# Altium schematic symbol library IC.SchLib: 555 symbols (part 8 of 15)
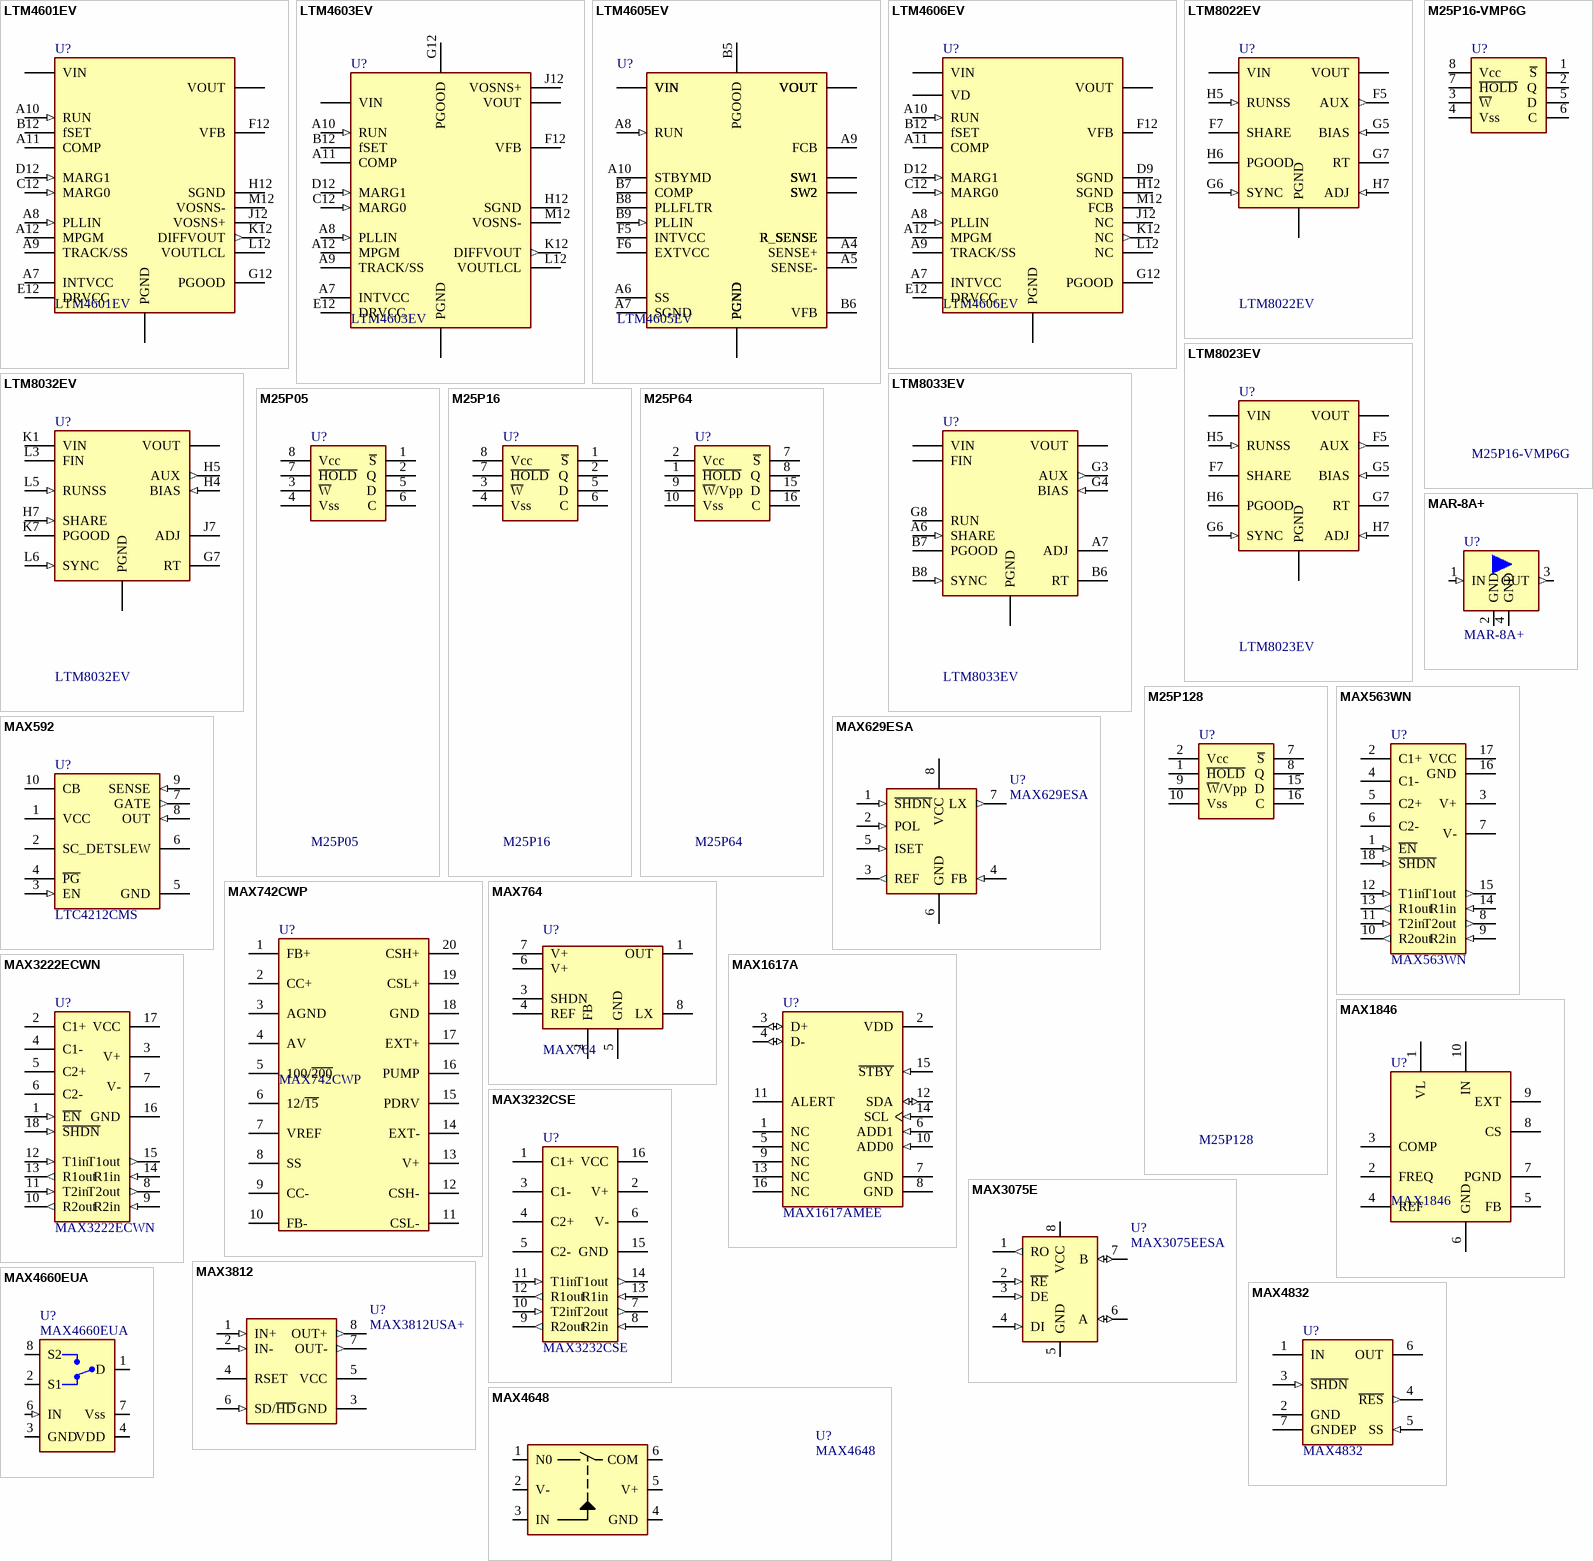
[diagram p77: symbols LTM4601EV to MAX4832]

## LTM8023EV
designator U?
2A, 36Vin DC/DC Module nonisolated; Manufacturer: Linear Technologies; Manufacturer No: LTM8023EV#PBF; Comment2: 3.6-36Vin; 0.8-10Vout; 2A; Sort: 510; Tech: SMDR; Package: LGA50; Price: 0
footprint LGA50 (LGA, 50-Leads, Body 11,25x9,0mm,  Pitch 1,27mm)
pins: A1 VOUT (power), A2 VOUT (power), A3 VOUT (power), A4 VOUT (power), A5 PGND (power), A6 PGND (power), A7 PGND (power), B1 VOUT (power), B2 VOUT (power), B3 VOUT (power), B4 VOUT (power), B5 PGND (power), B6 PGND (power), B7 PGND (power), C1 VOUT (power), C2 VOUT (power), C3 VOUT (power), C4 VOUT (power), C5 PGND (power), C6 PGND (power), C7 PGND (power), D1 PGND (power), D2 PGND (power), D3 PGND (power), D4 PGND (power), D5 PGND (power), D6 PGND (power), D7 PGND (power), E1 PGND (power), E2 PGND (power), E3 PGND (power), E4 PGND (power), E5 PGND (power), E6 PGND (power), E7 PGND (power), F5 AUX (out), F6 PGND (power), F7 SHARE, G1 VIN (power), G2 VIN (power), G3 VIN (power), G5 BIAS (in), G6 SYNC (in), G7 RT, H1 VIN (power), H2 VIN (power), H3 VIN (power), H5 RUNSS (in), H6 PGOOD (oc), H7 ADJ (in), M10 VOUT (power) hidden, M11 VOUT (power) hidden

## LTM8032EV
designator U?
2A, 36Vin DC/DC Module nonisolated; Manufacturer: Linear Technologies; Manufacturer No: LTM8032EV#PBF; Comment2: 3.6-36Vin; 0.8-10Vout; 2A low EMI; Sort: 510; Tech: SMDR; Package: LGA71; Price: 0
footprint LGA71 (LGA, 71-Leads, Body 15,0x9,0mm,  Pitch 1,27mm)
pins: A1 VOUT (power), A2 VOUT (power), A3 VOUT (power), A4 VOUT (power), A5 PGND (power), A6 PGND (power), A7 PGND (power), B1 VOUT (power), B2 VOUT (power), B3 VOUT (power), B4 VOUT (power), B5 PGND (power), B6 PGND (power), B7 PGND (power), C1 VOUT (power), C2 VOUT (power), C3 VOUT (power), C4 VOUT (power), C5 PGND (power), C6 PGND (power), C7 PGND (power), D1 VOUT (power), D2 VOUT (power), D3 VOUT (power), D4 VOUT (power), D5 PGND (power), D6 PGND (power), D7 PGND (power), E1 PGND (power), E2 PGND (power), E3 PGND (power), E4 PGND (power), E5 PGND (power), E6 PGND (power), E7 PGND (power), F1 PGND (power), F2 PGND (power), F3 PGND (power), F4 PGND (power), F5 PGND (power), F6 PGND (power), F7 PGND (power), G1 PGND (power), G2 PGND (power), G3 PGND (power), G4 PGND (power), G5 PGND (power), G6 PGND (power), G7 RT, H1 PGND (power), H2 PGND (power), H3 PGND (power), H4 BIAS (in), H5 AUX (out), H6 PGND (power), H7 SHARE (in), J5 PGND (power), J6 PGND (power), J7 ADJ, K1 VIN (power), K2 VIN (power), K3 FIN, K5 PGND (power), K6 PGND (power), K7 PGOOD, L1 VIN (power), L2 VIN (power), L3 FIN (power), L5 RUNSS (in), L6 SYNC (in), L7 PGND (power)

## LTM8033EV
designator U?
3A, 36Vin DC/DC Module nonisolated; Manufacturer: Linear Technologies; Manufacturer No: LTM8033EV#PBF; Comment2: 3.6-36Vin; 0.8-24Vout; 3A low EMI; Sort: 510; Tech: SMDR; Package: LGA71; Price: 0
footprint LGA76 (LGA, 76-Leads, Body 15,0x11,25mm,  Pitch 1,27mm)
pins: A1 VOUT (power), A2 VOUT (power), A3 VOUT (power), A4 PGND (power), A5 PGND (power), A6 SHARE (in), A7 ADJ, A8 PGND (power), B1 VOUT (power), B2 VOUT (power), B3 VOUT (power), B4 PGND (power), B5 PGND (power), B6 RT, B7 PGOOD, B8 SYNC (in), C1 VOUT (power), C2 VOUT (power), C3 VOUT (power), C4 PGND (power), C5 PGND (power), C6 PGND (power), C7 PGND (power), C8 PGND (power), D1 VOUT (power), D2 VOUT (power), D3 VOUT (power), D4 PGND (power), D5 PGND (power), D6 PGND (power), D7 PGND (power), D8 PGND (power), E1 PGND (power), E2 PGND (power), E3 PGND (power), E4 PGND (power), E5 PGND (power), E6 PGND (power), E7 PGND (power), E8 PGND (power), F1 PGND (power), F2 PGND (power), F3 PGND (power), F4 PGND (power), F5 PGND (power), F6 PGND (power), F7 PGND (power), F8 PGND (power), G1 PGND (power), G2 PGND (power), G3 AUX (out), G4 BIAS (in), G5 PGND (power), G6 PGND (power), G8 RUN, H5 PGND (power), H6 PGND (power), J1 VIN (power), J2 VIN (power), J3 VIN (power), J5 PGND (power), J6 PGND (power), J8 FIN (power), K1 VIN (power), K2 VIN (power), K3 VIN (power), K5 PGND (power), K6 PGND (power), K8 FIN, L1 VIN (power), L2 VIN (power), L3 VIN (power), L5 PGND (power), L6 PGND (power), L8 FIN

## M25P05
designator U?
512 Kbit, low voltage, serial flash memory with 50MHz SPI bus; Manufacturer: Numonyx; Manufacturer No: M25P05-AVMN6P; Comment2: 512Kbit, SPI, 40/50MHz; Sort: 510; Tech: SMDR; Package: SOIC8; Price: 0
footprint SOIC8-1
pins: 1 ~{S}, 2 Q, 3 ~{W}, 4 Vss, 5 D, 6 C, 7 ~{HOLD}, 8 Vcc

## M25P16
designator U?
16Mbit, low voltage, serial flash memory with 50MHz SPI bus; Manufacturer: Numonyx; Manufacturer No: M25P16-VMN6P; Comment2: 16Mbit, SPI, 40/50MHz; Sort: 510; Tech: SMDR; Package: SOIC8; Price: 0
footprint SOIC8-1
pins: 1 ~{S}, 2 Q, 3 ~{W}, 4 Vss, 5 D, 6 C, 7 ~{HOLD}, 8 Vcc

## M25P16-VMP6G
designator U?
16Mbit, low voltage, serial flash memory with 50MHz SPI bus; Manufacturer: Micron; Comment2: 16Mbit, SPI, 75MHz, 2.7~3.6Vcc,  -40~85degC; Sort: 510; Tech: SMDR; Manufacturer No: M25P16-VMP6G; Package: VFQFPN8; Price: 0
footprint DFN127P600X500X100EP340-8N (QFN, 8-Leads, Body 5,0x6,0mm (max), Pitch 1,27mm, IPC Medium Density)
pins: 1 ~{S}, 2 Q, 3 ~{W}, 4 Vss, 5 D, 6 C, 7 ~{HOLD}, 8 Vcc

## M25P64
designator U?
64 Mbit, low voltage, serial flash memory with 50MHz SPI bus; Manufacturer: Numonyx; Manufacturer No: M25P64-VMF6TP; Comment2: 64Mbit, SPI, 50MHz; Sort: 510; Tech: SMDR; Package: SO16; Price: 0
footprint Model Name (Footprint not found)
footprint SOIC16WN (SOIC, 16-Leads, Body 10,4x7,5mm (max), Pitch 1,27mm, IPC Medium Density)
pins: 1 ~{HOLD}, 2 Vcc, 7 ~{S}, 8 Q, 9 ~{W}/Vpp, 10 Vss, 15 D, 16 C

## M25P128
designator U?
128 Mbit, low voltage, serial flash memory with 50MHz SPI bus; Manufacturer: Numonyx; Manufacturer No: M25P128-VMF6TPB; Comment2: 128Mbit, SPI, 50MHz; Sort: 510; Tech: SMDR; Package: SO16; Price: 0
footprint Model Name (Footprint not found)
footprint SOIC16WN (SOIC, 16-Leads, Body 10,4x7,5mm (max), Pitch 1,27mm, IPC Medium Density)
pins: 1 ~{HOLD}, 2 Vcc, 7 ~{S}, 8 Q, 9 ~{W}/Vpp, 10 Vss, 15 D, 16 C

## MAR-8A+
designator U?
Monolithic Amplifier DC - 1GHz; Manufacturer: MiniCircuits; Sort: 530; Tech: SMDR; Manufacturer No: MAR-8A+; Package: VV105; Price: 0
footprint VV105 (RF transistor 4pin D2.2x1.5mm)
pins: 1 IN (in), 2 GND (power), 3 OUT (out), 4 GND (power)

## MAX563WN
designator U?
Dual transciever +3V3 with shitdown; Manufacturer: Maxim; Manufacturer No: MAX563WN+; Sort: 510; Tech: SMDR; Package: SOIC18W; Price: 0
footprint SOIC18WN (SOIC18W, Body 11,7x7,6mm, R1,27mm, IPC Medium Density)
pins: 1 ~{EN} (in), 2 C1+, 3 V+, 4 C1-, 5 C2+, 6 C2-, 7 V-, 8 T2out (out), 9 R2in (in), 10 R2out (out), 11 T2in (in), 12 T1in (in), 13 R1out (out), 14 R1in (in), 15 T1out (out), 16 GND (power), 17 VCC (power), 18 ~{SHDN} (in)

## MAX592
designator U?, comment LTC4212CMS
Hot swap controller MSOP10 with ON control; Manufacturer: Maxim; Comment2: 2.5-16.5V; Sort: 510; Tech: SMDR; Manufacturer No: LTC4212CMS; Package: MSOP10; Price: 0
footprint SSOP16 (SSOP 16-Leads, Body 5,0x4,0mm (max), Pitch 0,63mm, IPC Medium Density)
pins: 1 VCC (power), 2 SC_DET, 3 EN (in), 4 ~{PG} (oc), 5 GND (power), 6 SLEW, 7 GATE (out), 8 OUT (in), 9 SENSE (in), 10 CB

## MAX629ESA
designator U?
Step up converter 0.5A SOIC8; Manufacturer: Maxim; Sort: 510; Tech: SMDR; Manufacturer No: MAX629ESA; Package: SOIC8; Price: 0
footprint SOIC8-1
pins: 1 ~{SHDN} (in), 2 POL (in), 3 REF (out), 4 FB (in), 5 ISET (in), 6 GND (power), 7 LX (out), 8 VCC (power)

## MAX742CWP
designator U?
Switch-Mode Regulator with  +5V to ±12V or ±15V Dual Output; Manufacturer: Maxim; Sort: 510; Tech: SMDR; Manufacturer No: MAX742CWP; Package: SO20; Price: 0
footprint SOIC20N (SOIC20, Body 12,9x7,6mm, R1,27mm, IPC Medium Density)
pins: 1 FB+, 2 CC+, 3 AGND, 4 AV, 5 100/~{200}, 6 12/~{15}, 7 VREF, 8 SS, 9 CC-, 10 FB-, 11 CSL-, 12 CSH-, 13 V+, 14 EXT-, 15 PDRV, 16 PUMP, 17 EXT+, 18 GND, 19 CSL+, 20 CSH+

## MAX764
designator U?
-5V/-12V/-15V or Adjustable, High-Efficency, Low Iq DC-DC Inverters; Manufacturer: Maxim; Manufacturer No: MAX764ESA; Sort: 510; Tech: SMDR; Package: SOIC8; Price: 0
footprint SOIC8-1
pins: 1 OUT, 2 FB, 3 SHDN, 4 REF, 5 GND, 6 V+, 7 V+, 8 LX

## MAX1617A
designator U?, comment MAX1617AMEE
SMBus Temperature Sensor with Internal and External Diode Input; Manufacturer: Maxim; Manufacturer No: MAX1617AMEE+; Sort: 510; Tech: SMDR; Package: QSOP16; Price: 0
3D model QSOP16 (SSOP; 16 Leads; Body Width 3.9 mm; Pitch 0.635 mm)
footprint QSOP16 (SSOP; 16 Leads; Body Width 3.9 mm; Pitch 0.635 mm)
pins: 1 NC, 2 VDD (power), 3 D+ (io), 4 D- (io), 5 NC, 6 ADD1 (in), 7 GND (power), 8 GND (power), 9 NC, 10 ADD0 (in), 11 ALERT (oc), 12 SDA (io), 13 NC, 14 SCL (in), 15 ~{STBY} (in), 16 NC

## MAX1846
designator U?
High-Efficiency, Current-Mode,  Inverting PWM Controller; Manufacturer: Maxim; Manufacturer No: MAX1846EUB+; Comment2: 3-16.5Vin, 100-500kHz PWM; Sort: 510; Tech: SMDR; Package: 10 uMAX; Price: 0
footprint UMAX (uMAX/uSOP 10pin, Body 3.05x3.05mm (max), Pitch 0,5mm)
pins: 1 VL, 2 FREQ, 3 COMP, 4 REF, 5 FB, 6 GND, 7 PGND, 8 CS, 9 EXT, 10 IN

## MAX3075E
designator U?, comment MAX3075EESA
RS485 transceiver 3V3 TXen, RXen 500Kbps; Manufacturer: Maxim; Sort: 510; Tech: SMDR; Manufacturer No: MAX3075EESA; Package: SOIC8; Price: 0
footprint SOIC8-1
pins: 1 RO (out), 2 ~{RE} (in), 3 DE (in), 4 DI (in), 5 GND (power), 6 A (io), 7 B (io), 8 VCC (power)

## MAX3222ECWN
designator U?
Dual transciever +3V3 with shitdown; Manufacturer: Maxim; Manufacturer No: MAX3222ECWN+; Sort: 510; Tech: SMDR; Package: SOIC18W; Price: 0
footprint SOIC18WN (SOIC18W, Body 11,7x7,6mm, R1,27mm, IPC Medium Density)
pins: 1 ~{EN} (in), 2 C1+, 3 V+, 4 C1-, 5 C2+, 6 C2-, 7 V-, 8 T2out (out), 9 R2in (in), 10 R2out (out), 11 T2in (in), 12 T1in (in), 13 R1out (out), 14 R1in (in), 15 T1out (out), 16 GND (power), 17 VCC (power), 18 ~{SHDN} (in)

## MAX3232CSE
designator U?
Dual RS232 transciever +3V3; Manufacturer: Maxim; Sort: 510; Tech: SMDR; Manufacturer No: MAX3232CSE; Package: SOIC16; Price: 0
footprint SOIC16-1 (Small IC 16 pin)
pins: 1 C1+, 2 V+, 3 C1-, 4 C2+, 5 C2-, 6 V-, 7 T2out (out), 8 R2in (in), 9 R2out (out), 10 T2in (in), 11 T1in (in), 12 R1out (out), 13 R1in (in), 14 T1out (out), 15 GND (power), 16 VCC (power)

## MAX3812
designator U?, comment MAX3812USA+
Multirate SMPTE SD/HD Cable Driver  with Selectable Slew Rate; Manufacturer: Maxim; Comment2: +3.3V; Sort: 510; Tech: SMDR; Manufacturer No: MAX3812USA+; Package: SOIC8; Price: 0
footprint SOIC8-1
pins: 1 IN+ (in), 2 IN- (in), 3 GND (power), 4 RSET, 5 VCC (power), 6 SD/~{HD} (in), 7 OUT- (out), 8 OUT+ (out)

## MAX4648
designator U?
25R SPST Analog Switches in SOT23-6; Manufacturer: Maxim; Manufacturer No: MAX4648EUT-T+; Sort: 510; Tech: SMDR; Package: SOT23-6; Price: 0
footprint SOT23-6
pins: 1 N0, 2 V-, 3 IN, 4 GND, 5 V+, 6 COM

## MAX4660EUA
designator U?
High-Current, 25R, SPDT, CMOS  Analog Switch; Manufacturer: Maxim; Comment2: ±4.5..±20Vcc 25Rsw 150mAsw; Sort: 510; Tech: SMDR; Manufacturer No: MAX4660EUA; Package: 8 uMAX-EP; Price: 0
signal-integrity model Model Name (Model Description)
footprint UMAX8EP-L (TSOP, 8-Leads, Body 3,0x3,0mm (max), Pitch 0,65mm, IPC High Density)
footprint UMAX8EP-N (TSOP, 8-Leads, Body 3,0x3,0mm (max), Pitch 0,65mm, IPC Medium Density)
pins: 1 D, 2 S1, 3 GND (power), 4 VDD (power), 6 IN (in), 7 Vss (power), 8 S2, 9 EP (power)

## MAX4832
designator U?
Low drop regulator 0.1A SOT23-5; Manufacturer: Maxim; Sort: 510; Tech: SMDR; Price: 0
footprint QFN16N-2 (QFN, 16-Leads, Body 3,0x3,0mm (max), Pitch 0,50mm, IPC Medium Density)
pins: 1 IN (power), 2 GND (power), 3 ~{SHDN} (in), 4 ~{RES} (out), 5 SS (in), 6 OUT (power), 7 GNDEP (power)

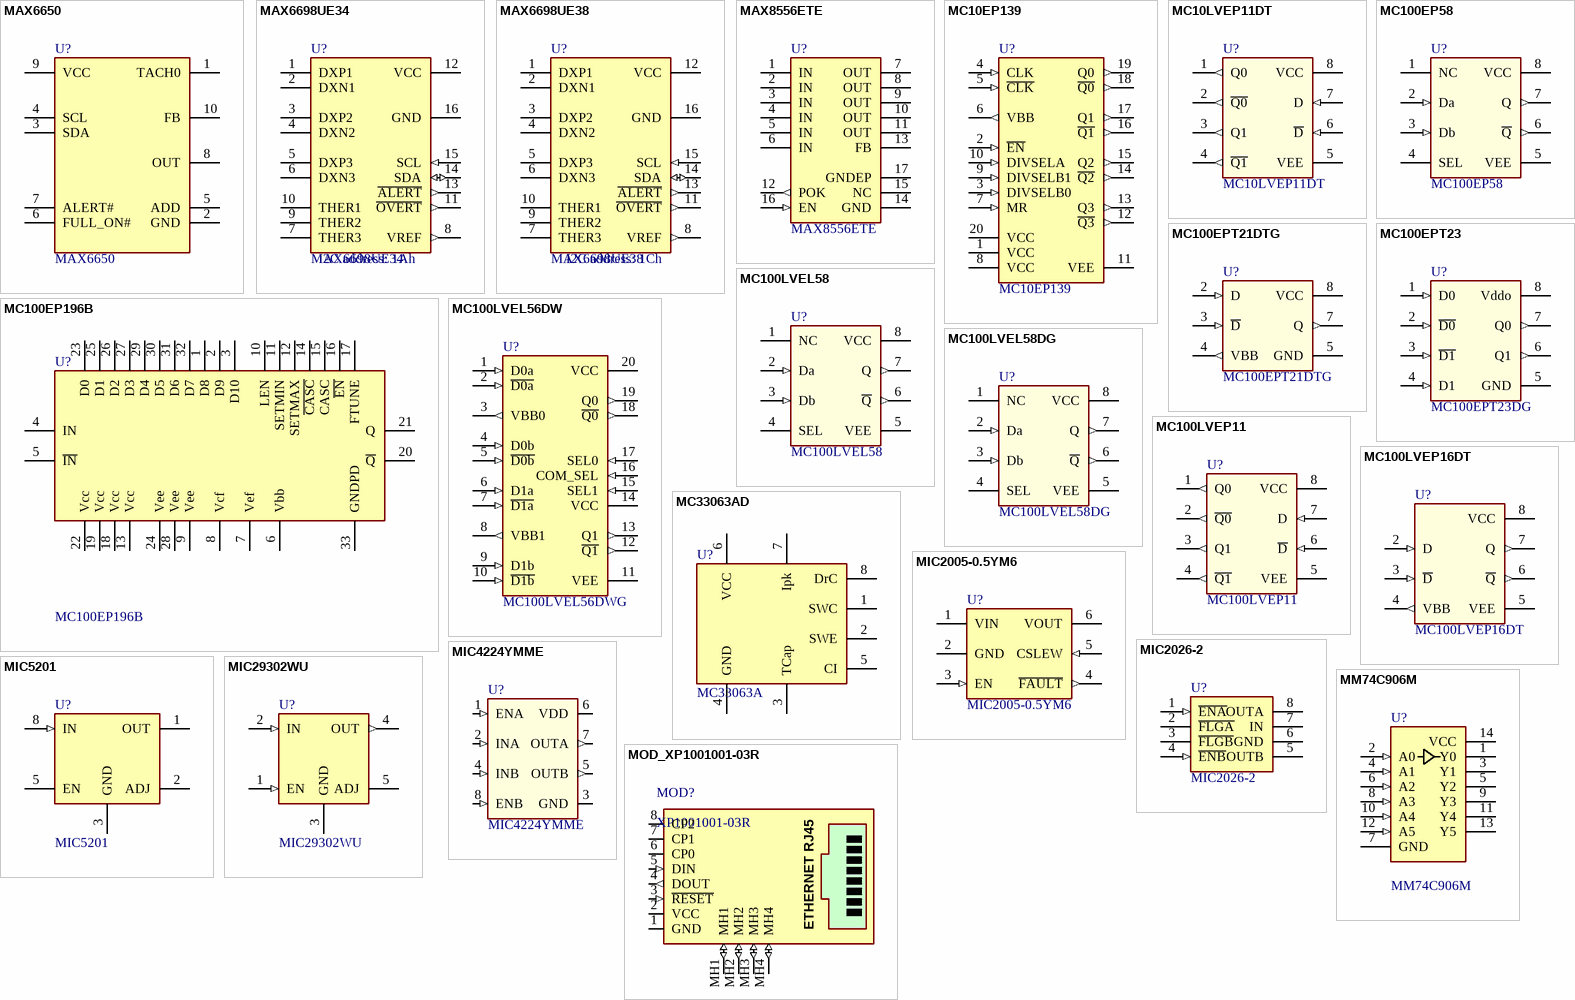
[diagram p32: symbols MAX6650 to MOD_XP1001001-03R]

## MAX6650
designator U?
Fan speed regulator and monitor I2C compatible; Manufacturer: Maxim; Manufacturer No: MAX6650EUB; Sort: 510; Tech: SMDR; Package: uMAX; Price: 0
footprint UMAX (uMAX/uSOP 10pin, Body 3.05x3.05mm (max), Pitch 0,5mm)
pins: 1 TACH0, 2 GND (power), 3 SDA, 4 SCL, 5 ADD, 6 FULL_ON#, 7 ALERT#, 8 OUT, 9 VCC (power), 10 FB

## MAX6698UE34
designator U?  I2C address: 1Ah
SMBus Temperature Sensor with Internal and External Diode/Thermistor Input; Manufacturer: Maxim, Mouser; Manufacturer No: MAX6698UE38+, 700-MAX6698UE34; Comment2: 3..5.5Vcc 1mAcc; Sort: 510; Tech: SMDR; Package: TSSOP16; Price: 6.8
3D model QSOP16 (SSOP; 16 Leads; Body Width 3.9 mm; Pitch 0.635 mm)
footprint TSSOP16 (TSSOP16 5x4.4mm R0.65mm)
pins: 1 DXP1, 2 DXN1, 3 DXP2, 4 DXN2, 5 DXP3, 6 DXN3, 7 THER3, 8 VREF (out), 9 THER2, 10 THER1, 11 ~{OVERT} (out), 12 VCC (power), 13 ~{ALERT} (out), 14 SDA (io), 15 SCL (in), 16 GND (power)

## MAX6698UE38
designator U?  I2C address: 1Ch
SMBus Temperature Sensor with Internal and External Diode/Thermistor Input; Manufacturer: Maxim; Manufacturer No: MAX6698UE38+; Comment2: 3..5.5Vcc 1mAcc; Sort: 510; Tech: SMDR; Package: TSSOP16; Price: 0
3D model QSOP16 (SSOP; 16 Leads; Body Width 3.9 mm; Pitch 0.635 mm)
footprint TSSOP16 (TSSOP16 5x4.4mm R0.65mm)
pins: 1 DXP1, 2 DXN1, 3 DXP2, 4 DXN2, 5 DXP3, 6 DXN3, 7 THER3, 8 VREF (out), 9 THER2, 10 THER1, 11 ~{OVERT} (out), 12 VCC (power), 13 ~{ALERT} (out), 14 SDA (io), 15 SCL (in), 16 GND (power)

## MAX8556ETE
designator U?
Low drop regulator 0.1A SOT23-5; Manufacturer: Maxim; Sort: 510; Tech: SMDR; Manufacturer No: MAX8556ETE; Package: QFN-16; Price: 0
footprint QFN16N-2 (QFN, 16-Leads, Body 3,0x3,0mm (max), Pitch 0,50mm, IPC Medium Density)
pins: 1 IN (power), 2 IN (power), 3 IN (power), 4 IN (power), 5 IN (power), 6 IN (power), 7 OUT (power), 8 OUT (power), 9 OUT (power), 10 OUT (power), 11 OUT (power), 12 POK (out), 13 FB, 14 GND (power), 15 NC, 16 EN (in), 17 GNDEP (power)

## MC10EP139
designator U?
ECL Clock Generation Chip; Manufacturer: ON Semiconductor; Manufacturer No: MC10EP139DTG; Sort: 510; Tech: SMDR; Package: TSSOP20; Price: 0
footprint TSSOP20N (TSSOP 20, Body 6,6x4,5mm, R0,65mm, IPC Medium Density)
pins: 1 VCC (power), 2 ~{EN} (in), 3 DIVSELB0 (in), 4 CLK (in), 5 ~{CLK} (in), 6 VBB (out), 7 MR (in), 8 VCC (power), 9 DIVSELB1 (in), 10 DIVSELA (in), 11 VEE (power), 12 ~{Q3} (out), 13 Q3 (out), 14 ~{Q2} (out), 15 Q2 (out), 16 ~{Q1} (out), 17 Q1 (out), 18 ~{Q0} (out), 19 Q0 (out), 20 VCC (power)

## MC10LVEP11DT
designator U?
2.5V / 3.3V ECL 1:2  Differential Fanout Buffer; Manufacturer: ON-Semiconductors; Manufacturer No: MC10LVEP11DTG; Sort: 510; Tech: SMDR; Package: TSSOP8; Price: 0
footprint TSSOP8 (TSSOP8 3x3mm R0.65mm)
signal-integrity model Model Name (Model Description)
pins: 1 Q0 (out), 2 ~{Q0} (out), 3 Q1 (out), 4 ~{Q1} (out), 5 VEE (power), 6 ~{D} (in), 7 D (in), 8 VCC (power)

## MC100EP58
designator U?
3.3V / 5V ECL 2:1 Multiplexer; Manufacturer: ON-Semiconductors; Manufacturer No: MC100EP58DG; Sort: 510; Tech: SMDR; Package: SOIC8; Price: 0
footprint SOIC8-1
signal-integrity model Model Name (Model Description)
pins: 1 NC, 2 Da (in), 3 Db (in), 4 SEL, 5 VEE (power), 6 ~{Q} (out), 7 Q (out), 8 VCC (power)

## MC100EP196B
designator U?
3.3 V ECL Programmable  Delay Chip With FTUNE; Manufacturer: ON Semiconductor; Manufacturer No: MC100EP196BMNG; Sort: 510; Tech: SMDR; Package: QFN32; Price: 0
footprint QFN50P500X500X100-32N (QFN, 32-Leads, Body 5,0x5,0mm (max), Pitch 0,50mm, IPC Medium Density)
pins: 1 D8, 2 D9, 3 D10, 4 IN, 5 ~{IN}, 6 Vbb, 7 Vef, 8 Vcf, 9 Vee, 10 LEN, 11 SETMIN, 12 SETMAX, 13 Vcc, 14 ~{CASC}, 15 CASC, 16 ~{EN}, 17 FTUNE, 18 Vcc, 19 Vcc, 20 ~{Q}, 21 Q, 22 Vcc, 23 D0, 24 Vee, 25 D1, 26 D2, 27 D3, 28 Vee, 29 D4, 30 D5, 31 D6, 32 D7, 33 GNDPD

## MC100EPT21DTG
designator U?
3.3V Differential LVPECL/LVDS to LVTTL/LVCMOS translator; Manufacturer: ON-Semiconductors; Manufacturer No: MC100LVEP21DTG; Sort: 510; Tech: SMDR; Package: TSSOP8; Price: 0
footprint TSSOP8 (TSSOP8 3x3mm R0.65mm)
signal-integrity model Model Name (Model Description)
pins: 1 NC (power) hidden, 2 D (in), 3 ~{D} (in), 4 VBB (out), 5 GND (power), 6 NC hidden, 7 Q (out), 8 VCC (power)

## MC100EPT23
designator U?, comment MC100EPT23DG
Dual Differential to LVCMOS/LVTTL translator; Manufacturer: On Semiconductor; Comment2: 3V3; Sort: 510; Tech: SMDR; Manufacturer No: MC100EPT23DG; Package: SOIC8; Price: 0
footprint SOIC8-1
signal-integrity model Model Name (Model Description)
pins: 1 D0 (in), 2 ~{D0} (in), 3 ~{D1} (in), 4 D1 (in), 5 GND (power), 6 Q1 (out), 7 Q0 (out), 8 Vddo (power)

## MC100LVEL56DW
designator U?, comment MC100LVEL56DWG
ECL Multiplexer 2:1 diff. in/out; Manufacturer: ON Semiconductor; Sort: 510; Tech: SMDR; Manufacturer No: MC100LVEL56DWG; Package: SOIC20; Price: 0
footprint SOIC20N (SOIC20, Body 12,9x7,6mm, R1,27mm, IPC Medium Density)
pins: 1 D0a (in), 2 ~{D0a} (in), 3 VBB0 (out), 4 D0b (in), 5 ~{D0b} (in), 6 D1a (in), 7 ~{D1a} (in), 8 VBB1 (out), 9 D1b (in), 10 ~{D1b} (in), 11 VEE (power), 12 ~{Q1} (out), 13 Q1 (out), 14 VCC (power), 15 SEL1 (in), 16 COM_SEL (in), 17 SEL0 (in), 18 ~{Q0} (out), 19 Q0 (out), 20 VCC (power)

## MC100LVEL58
designator U?
3.3V ECL 2:1 Multiplexer; Manufacturer: ON-Semiconductors; Manufacturer No: MC100LVEL58DG; Sort: 510; Tech: SMDR; Package: SOIC8; Price: 0
footprint SOIC8-1
signal-integrity model Model Name (Model Description)
pins: 1 NC, 2 Da (in), 3 Db (in), 4 SEL, 5 VEE (power), 6 ~{Q} (out), 7 Q (out), 8 VCC (power)

## MC100LVEL58DG
designator U?
3.3V ECL 2:1 Multiplexer; Manufacturer: ON-Semiconductors; Sort: 510; Tech: SMDR; Manufacturer No: MC100LVEL58DG; Package: SOIC8; Price: 0
footprint SOIC8-1
signal-integrity model Model Name (Model Description)
pins: 1 NC, 2 Da (in), 3 Db (in), 4 SEL, 5 VEE (power), 6 ~{Q} (out), 7 Q (out), 8 VCC (power)

## MC100LVEP11
designator U?
2.5V / 3.3V ECL 1:2  Differential Fanout Buffer; Manufacturer: ON-Semiconductors; Manufacturer No: MC100LVEP11DTG; Comment2: 3GHz, 130ps jitter; Sort: 510; Tech: SMDR; Package: SOIC8; Price: 0
footprint TSSOP8 (TSSOP8 3x3mm R0.65mm)
signal-integrity model Model Name (Model Description)
pins: 1 Q0 (out), 2 ~{Q0} (out), 3 Q1 (out), 4 ~{Q1} (out), 5 VEE (power), 6 ~{D} (in), 7 D (in), 8 VCC (power)

## MC100LVEP16DT
designator U?
2.5V/3.3V ECL Differential Receiver/Driver; Manufacturer: ON-Semiconductors; Manufacturer No: MC100LVEP16DTG; Sort: 510; Tech: SMDR; Package: TSSOP8; Price: 0
footprint TSSOP8 (TSSOP8 3x3mm R0.65mm)
signal-integrity model Model Name (Model Description)
pins: 1 NC (power) hidden, 2 D (in), 3 ~{D} (in), 4 VBB (out), 5 VEE (power), 6 ~{Q} (out), 7 Q (out), 8 VCC (power)

## MC33063AD
designator U?, comment MC33063A
1.5-A BOOST/BUCK/INVERTING SWITCHING REGULATORS; Manufacturer: Texas Instruments; Manufacturer No: MC33063AD; Comment2: 2.5-24Vin, 42Vout; 3A; Sort: 510; Tech: SMDR; Package: D (SOIC); Price: 0
footprint SOIC8-1
pins: 1 SWC, 2 SWE, 3 TCap, 4 GND, 5 CI, 6 VCC, 7 Ipk, 8 DrC

## MIC2005-0.5YM6
designator U?
Fixed Current Limit  Power Distribution Switch; Manufacturer: Micrel; Comment2: 0.5A fixed; Sort: 510; Tech: SMDR; Manufacturer No: MIC2005-0.5YM6; Package: SOT23-6; Price: 0
footprint SOT23-6
pins: 1 VIN (power), 2 GND (power), 3 EN (in), 4 ~{FAULT} (out), 5 CSLEW (in), 6 VOUT (power)

## MIC2026-2
designator U?
Dual-Channel Power Distribution Switch - Active Low; Manufacturer: Micrel; Manufacturer No: MIC2026-2YM; Sort: 510; Tech: SMDR; Package: SOIC8; Price: 0
footprint SOIC8-1
pins: 1 ~{ENA} (in), 2 ~{FLGA} (oc), 3 ~{FLGB} (oc), 4 ~{ENB} (in), 5 OUTB (power), 6 GND (power), 7 IN (power), 8 OUTA (power)

## MIC4224YMME
designator U?
Dual noninverting mosfet driver; Manufacturer: Micrel, Farnell; Manufacturer No: MIC4224YMME, 1822376; Comment2: 4.5..18Vcc 4Aout; Sort: 520; Tech: SMDR; Package: MSOP8; Price: 2.15
signal-integrity model Model Name (Model Description)
footprint MSOP8N
pins: 1 ENA (in), 2 INA (in), 3 GND (power), 4 INB (in), 5 OUTB (out), 6 VDD (power), 7 OUTA (out), 8 ENB (in)
1 alternate drawing of the same symbol

## MIC5201
designator U?
200mA Low-Dropout Regulator; Manufacturer: Micrel; Manufacturer No: MIC5201BM; Comment2: 2.5V to 16V, 200mA, 0.2Vdo; Sort: 510; Tech: SMDR; Package: SO8; Price: 0
footprint SO8
pins: 1 OUT, 2 ADJ, 3 GND, 5 EN, 8 IN (in)

## MIC29302WU
designator U?
Low drop regulator 3A  TO263-5; Manufacturer: Micrel; Sort: 510; Tech: SMDR; Manufacturer No: MIC29302WU; Price: 0
footprint TO263-5
pins: 1 EN (in), 2 IN (in), 3 GND (power), 4 OUT (out), 5 ADJ (hiz)

## MM74C906M
designator U?
Hex Open Drain N-Channel Buffers; Manufacturer: Fairchild, Farnell; Manufacturer No: MM74C906M, 1607616; Comment2: 3-15V, 18Vod; Sort: 510; Tech: SMDR; Package: SOIC14; Price: 0
footprint SOIC14-1 (Small IC 14 pin)
pins: 1 Y0 (oc), 2 A0 (in), 3 Y1 (oc), 4 A1 (in), 5 Y2 (oc), 6 A2 (in), 7 GND (power), 8 A3 (in), 9 Y3 (oc), 10 A4 (in), 11 Y4 (oc), 12 A5 (in), 13 Y5 (oc), 14 VCC (power)

## MOD_XP1001001-03R
designator MOD?, comment XP1001001-03R
Ethernet to serial module; Manufacturer: Lantronix, Farnell; Manufacturer No: XP1001001-03R, 1297883; Comment2: 3.3Vcc 0.27Acc 10/100Mbit; Sort: 590; Tech: THTW
footprint MOD_XP1001001 (Ethernet controller module)
pins: 1 GND (power), 2 VCC (power), 3 ~{RESET} (in), 4 DOUT (out), 5 DIN (in), 6 CP0 (io), 7 CP1 (io), 8 CP2 (io), MH1 (io), MH2 (io), MH3 (io), MH4 (io)
text: ETHERNET RJ45

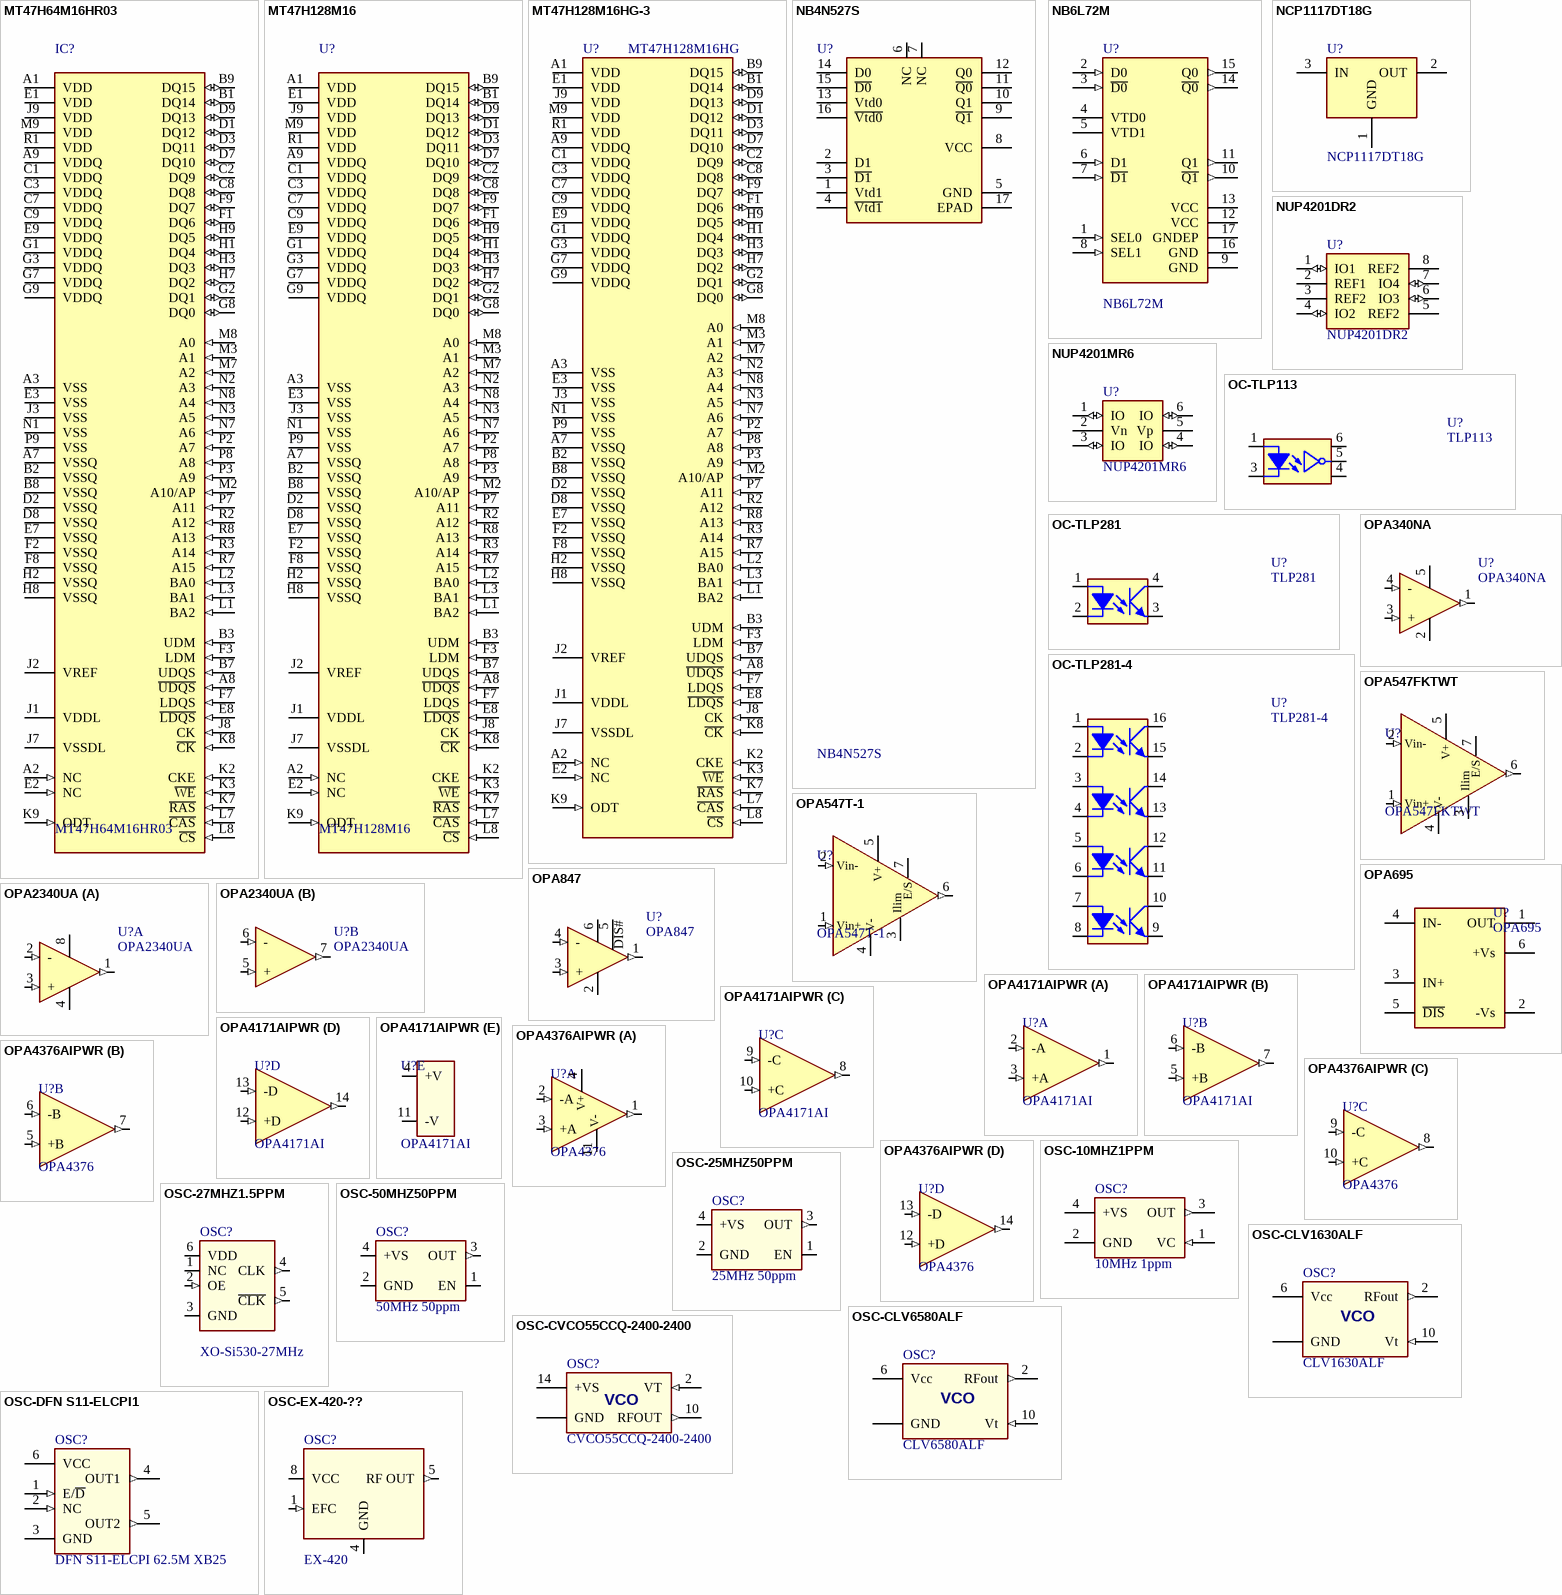
[diagram p33: symbols MT47H64M16HR03 to OSC-EX-420-??]

## MT47H64M16HR03
designator IC?
1Gb Synchronous High-Speed CMOS DRAM, 64Mb x 16Bit x 16 Banks, 84-Ball FPGA, Commercial; Manufacturer: Micron; Sort: 510; Tech: SMDR; Package: BGA84; Manufacturer No: MT47H64M16HR03
footprint FBGA84DDR2 (BGA, 84-Leads, Body 14,0x11,5mm,  Pitch 0,80mm)
pins: A1 VDD (power) "Power Supply", A2 NC (in), A3 VSS (power) "Ground", A7 VSSQ (power) "DQ Ground", A8 ~{UDQS} (in) "Data Strobe for DQ8-DQ15", A9 VDDQ (power) "DQ Power", B1 DQ14 (io) "Data Input/Output 14", B2 VSSQ (power) "DQ Ground", B3 UDM (in) "Input/Output Mask for DQ8-DQ15", B7 UDQS (in) "Data Strobe for DQ8-DQ15", B8 VSSQ (power) "DQ Ground", B9 DQ15 (io) "Data Input/Output 15", C1 VDDQ (power) "DQ Power", C2 DQ9 (io) "Data Input/Output 9", C3 VDDQ (power) "DQ Power", C7 VDDQ (power) "DQ Power", C8 DQ8 (io) "Data Input/Output 8", C9 VDDQ (power) "DQ Power", D1 DQ12 (io) "Data Input/Output 12", D2 VSSQ (power) "DQ Ground", D3 DQ11 (io) "Data Input/Output 11", D7 DQ10 (io) "Data Input/Output 10", D8 VSSQ (power) "DQ Ground", D9 DQ13 (io) "Data Input/Output 13", E1 VDD (power) "Power Supply", E2 NC (in), E3 VSS (power) "Ground", E7 VSSQ (power) "DQ Ground", E8 ~{LDQS} (in) "Data Strobe for DQ0-DQ7", E9 VDDQ (power) "DQ Power", F1 DQ6 (io) "Data Input/Output 6", F2 VSSQ (power) "DQ Ground", F3 LDM (in) "Input/Output Mask for DQ0-DQ7", F7 LDQS (in) "Data Strobe for DQ0-DQ7", F8 VSSQ (power) "DQ Ground", F9 DQ7 (io) "Data Input/Output 7", G1 VDDQ (power) "DQ Power", G2 DQ1 (io) "Data Input/Output 1", G3 VDDQ (power) "DQ Power", G7 VDDQ (power) "DQ Power", G8 DQ0 (io) "Data Input/Output 0", G9 VDDQ (power) "DQ Power", H1 DQ4 (io) "Data Input/Output 4", H2 VSSQ (power) "DQ Ground", H3 DQ3 (io) "Data Input/Output 3", H7 DQ2 (io) "Data Input/Output 2", H8 VSSQ (power) "DQ Ground", H9 DQ5 (io) "Data Input/Output 5", J1 VDDL (power) "DL Power", J2 VREF (power) "Vref", J3 VSS (power) "Ground", J7 VSSDL (power) "DL Ground", J8 CK (in) "Clock", J9 VDD (power) "Power Supply", K2 CKE (in) "Clock Enable", K3 ~{WE} (in) "Command Input", K7 ~{RAS} (in) "Command Input", K8 ~{CK} (in) "Clock", K9 ODT (in), L1 BA2 (in), L2 BA0 (in) "Bank Address Input 0", L3 BA1 (in) "Bank Address Input 1", L7 ~{CAS} (in) "Command Input", L8 ~{CS} (in) "Chip Select", M2 A10/AP (in) "Address Input 10", M3 A1 (in) "Address Input 1", M7 A2 (in) "Address Input 2", M8 A0 (in) "Address Input 0", M9 VDD (power) "Power Supply", N1 VSS (power) "Ground", N2 A3 (in) "Address Input 3", N3 A5 (in) "Address Input 5", N7 A6 (in) "Address Input 6", N8 A4 (in) "Address Input 4", P2 A7 (in) "Address Input 7", P3 A9 (in) "Address Input 9", P7 A11 (in) "Address Input 11", P8 A8 (in) "Address Input 8", P9 VSS (power) "Ground", R1 VDD (power) "Power Supply", R2 A12 (in) "Address Input 12", R3 A14 (in), R7 A15 (in), R8 A13 (in)

## MT47H128M16
designator U?
2Gb Synchronous High-Speed CMOS DRAM, 128Mb x 16Bit x 16 Banks, 84-Ball FPGA, Commercial; Manufacturer: Micron; Sort: 510; Tech: SMDR; Package: BGA84; Manufacturer No: MT47H128M16
footprint FBGA92DDR2WIDE (BGA, 84+8-Leads, Body 17,0x11,5mm,  Pitch 0,80mm)
pins: A1 VDD (power) "Power Supply", A2 NC (in), A3 VSS (power) "Ground", A7 VSSQ (power) "DQ Ground", A8 ~{UDQS} (in) "Data Strobe for DQ8-DQ15", A9 VDDQ (power) "DQ Power", B1 DQ14 (io) "Data Input/Output 14", B2 VSSQ (power) "DQ Ground", B3 UDM (in) "Input/Output Mask for DQ8-DQ15", B7 UDQS (in) "Data Strobe for DQ8-DQ15", B8 VSSQ (power) "DQ Ground", B9 DQ15 (io) "Data Input/Output 15", C1 VDDQ (power) "DQ Power", C2 DQ9 (io) "Data Input/Output 9", C3 VDDQ (power) "DQ Power", C7 VDDQ (power) "DQ Power", C8 DQ8 (io) "Data Input/Output 8", C9 VDDQ (power) "DQ Power", D1 DQ12 (io) "Data Input/Output 12", D2 VSSQ (power) "DQ Ground", D3 DQ11 (io) "Data Input/Output 11", D7 DQ10 (io) "Data Input/Output 10", D8 VSSQ (power) "DQ Ground", D9 DQ13 (io) "Data Input/Output 13", E1 VDD (power) "Power Supply", E2 NC (in), E3 VSS (power) "Ground", E7 VSSQ (power) "DQ Ground", E8 ~{LDQS} (in) "Data Strobe for DQ0-DQ7", E9 VDDQ (power) "DQ Power", F1 DQ6 (io) "Data Input/Output 6", F2 VSSQ (power) "DQ Ground", F3 LDM (in) "Input/Output Mask for DQ0-DQ7", F7 LDQS (in) "Data Strobe for DQ0-DQ7", F8 VSSQ (power) "DQ Ground", F9 DQ7 (io) "Data Input/Output 7", G1 VDDQ (power) "DQ Power", G2 DQ1 (io) "Data Input/Output 1", G3 VDDQ (power) "DQ Power", G7 VDDQ (power) "DQ Power", G8 DQ0 (io) "Data Input/Output 0", G9 VDDQ (power) "DQ Power", H1 DQ4 (io) "Data Input/Output 4", H2 VSSQ (power) "DQ Ground", H3 DQ3 (io) "Data Input/Output 3", H7 DQ2 (io) "Data Input/Output 2", H8 VSSQ (power) "DQ Ground", H9 DQ5 (io) "Data Input/Output 5", J1 VDDL (power) "DL Power", J2 VREF (power) "Vref", J3 VSS (power) "Ground", J7 VSSDL (power) "DL Ground", J8 CK (in) "Clock", J9 VDD (power) "Power Supply", K2 CKE (in) "Clock Enable", K3 ~{WE} (in) "Command Input", K7 ~{RAS} (in) "Command Input", K8 ~{CK} (in) "Clock", K9 ODT (in), L1 BA2 (in), L2 BA0 (in) "Bank Address Input 0", L3 BA1 (in) "Bank Address Input 1", L7 ~{CAS} (in) "Command Input", L8 ~{CS} (in) "Chip Select", M2 A10/AP (in) "Address Input 10", M3 A1 (in) "Address Input 1", M7 A2 (in) "Address Input 2", M8 A0 (in) "Address Input 0", M9 VDD (power) "Power Supply", N1 VSS (power) "Ground", N2 A3 (in) "Address Input 3", N3 A5 (in) "Address Input 5", N7 A6 (in) "Address Input 6", N8 A4 (in) "Address Input 4", P2 A7 (in) "Address Input 7", P3 A9 (in) "Address Input 9", P7 A11 (in) "Address Input 11", P8 A8 (in) "Address Input 8", P9 VSS (power) "Ground", R1 VDD (power) "Power Supply", R2 A12 (in) "Address Input 12", R3 A14 (in), R7 A15 (in), R8 A13 (in)